# Altium footprint library RODION.PcbLib: 131 footprints (part 5 of 9)
Each footprint in its own frame and in the unit in brackets; x right, y up, seen from the top. Pads: shape width x height; smd on the part's side, far side on the other; paste and mask are expansions set on the pad; w line width, h text height; cw(c..) or ccw(c..) is an arc to the next point about the centre after c.
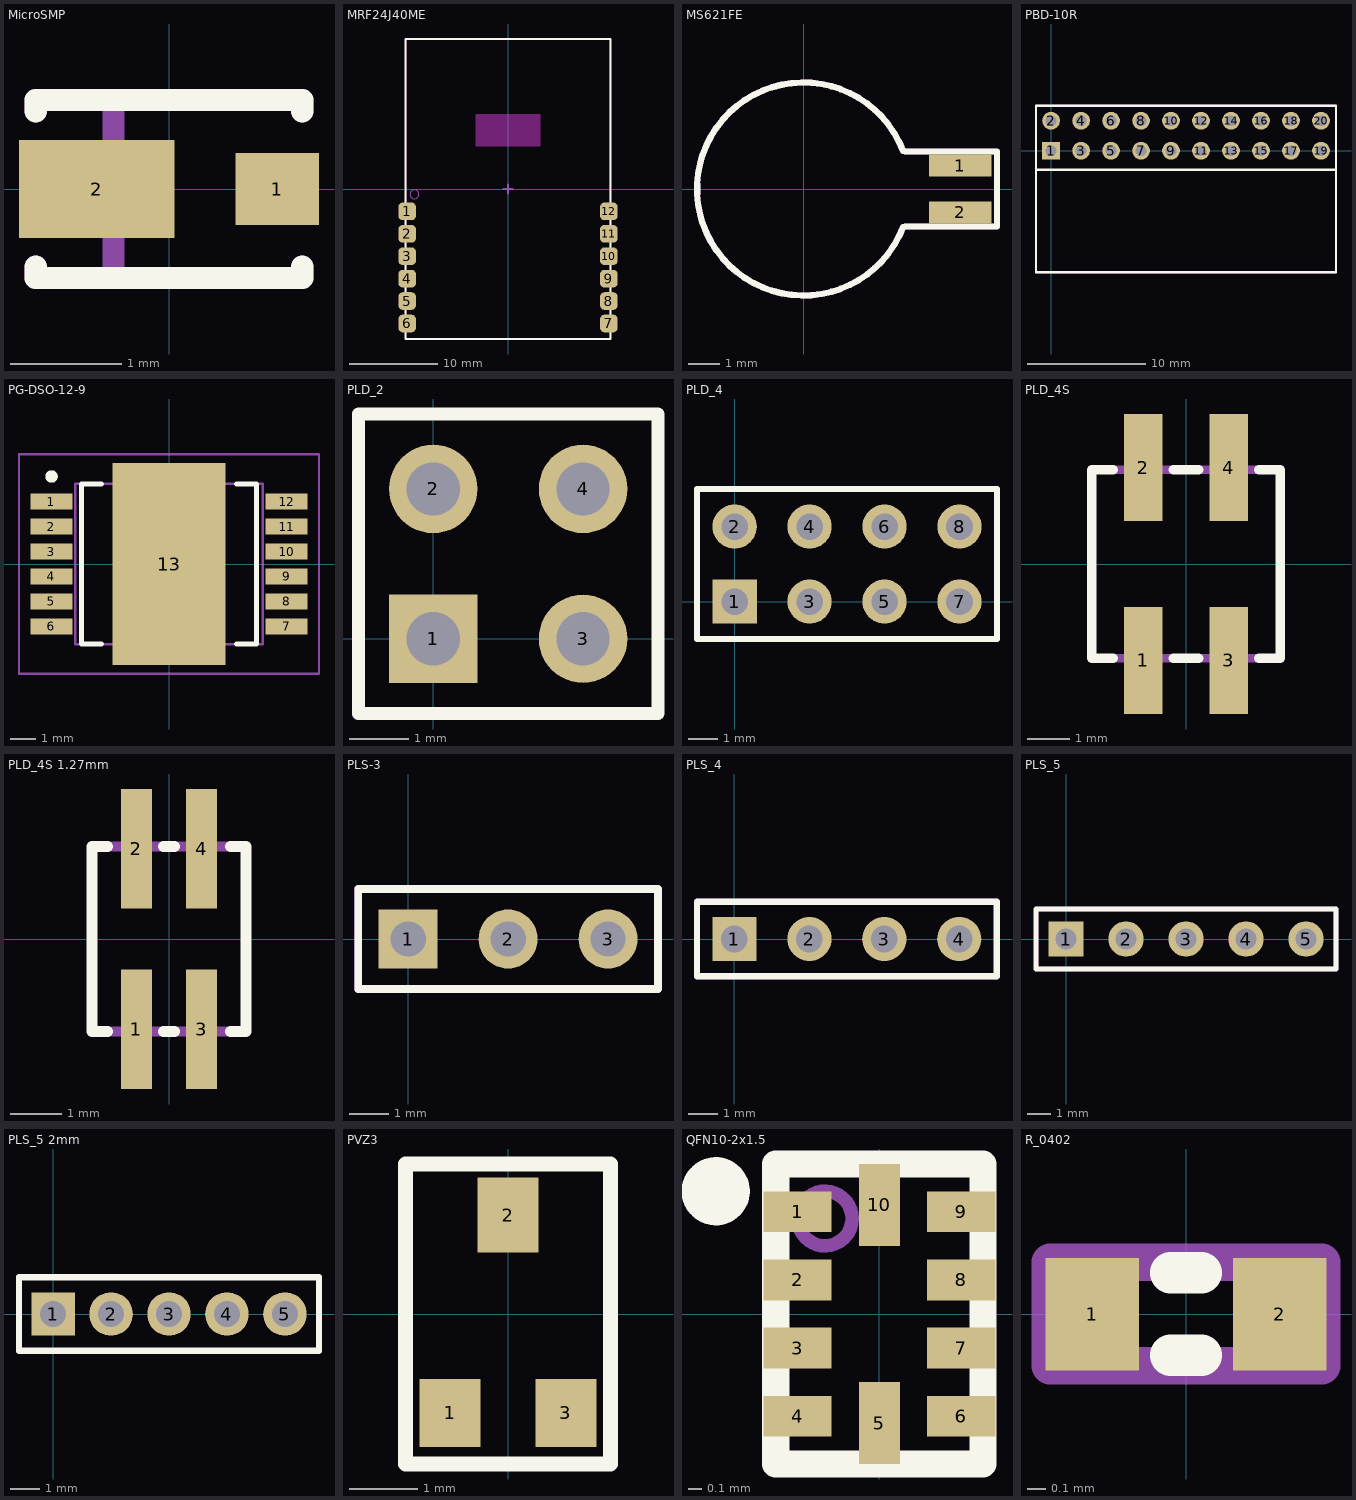
[diagram p4: the footprints below, top view; thin cyan lines are the x and y axes]

## MicroSMP [mm] "MicroSMP; 2 Leads"
height 0.68
pads (2):
  rect 0.75x0.65 smd: 1(0.975,0)
  rect 1.4x0.88 smd: 2(-0.65,0)
Top Overlay:
  lines w0.2: -1.2,-0.7 -1.2,-0.8 1.2,-0.8 1.2,-0.7 ; -1.2,0.7 -1.2,0.8 1.2,0.8 1.2,0.7
Top_Assy:
  lines w0.2: -1.2,-0.7 -1.2,-0.8 1.2,-0.8 1.2,-0.7 ; -1.2,0.7 -1.2,0.8 1.2,0.8 1.2,0.7 ; -0.5,-0.8 -0.5,0.8
  text ".Designator" at -0.125,-0.425 h1
3D body "MicroSMP.STEP": height 0.73, standoff 0, extent -1.35,-0.7 1.35,0.7

## MRF24J40ME [mm] "Wireless Transceiver"
height 4
pads (12):
  rrect50% 2x2 smd: 1(-11.43,-2.54) 2(-11.43,-5.08) 3(-11.43,-7.62) 4(-11.43,-10.16) 5(-11.43,-12.7) 6(-11.43,-15.24) 7(11.43,-15.24) 8(11.43,-12.7) 9(11.43,-10.16) 10(11.43,-7.62) 11(11.43,-5.08) 12(11.43,-2.54)
Top Overlay:
  lines w0.2: -11.6,-17 11.6,-17 ; -11.6,17 11.6,17
  lines w0.22: -11.6,-17 -11.6,17 ; 11.6,-17 11.6,17
Keep-Out Layer:
  rectangle: -3.68,4.82 3.68,8.5
Top_Assy:
  circle w0.1: c-10.6,-0.6 r0.5
  lines w0.2: -0.5,0 0.5,0 ; 0,-0.5 0,0.5 ; -11.6,-17 11.6,-17 11.6,17 -11.6,17 -11.6,-17
  text ".Designator" at -5.975,-5.275 h1
3D body "MRF24J40MB.STEP": height 3.36, standoff 0, extent -11.43,-16.51 11.43,16.51

## MS621FE [mm] "RTC Battery"
height 2.7
pads (2):
  rect 2x0.7 smd: 1(5,0.75) 2(5,-0.75)
Top Overlay:
  lines w0.2: 3.174,-1.218 cw(c0,0) 3.174,1.218 ; 3.25,-1.2 6.175,-1.2 6.175,1.2 3.25,1.2
Top_Assy:
  lines w0.2: 3.174,-1.218 cw(c0,0) 3.174,1.218 ; 3.25,-1.2 6.175,-1.2 6.175,1.2 3.25,1.2
  text ".Designator" at -2.5,-0.325 h1
3D body "MS621FE.stp": height 2.71, standoff 0.01, extent -3.4,-3.424 5.9,3.375

## PBD-10R [mm] "Connector; Header; 10x2 Position, Right angle"
height 5.08
pads (20):
  rect 1.5x1.5 hole 0.9: 1(0,0)
  round 1.5 hole 0.9: 2(0,2.54) 3(2.54,0) 4(2.54,2.54) 5(5.08,0) 6(5.08,2.54) 7(7.62,0) 8(7.62,2.54) 9(10.16,0) 10(10.16,2.54) 11(12.7,0) 12(12.7,2.54) 13(15.24,0) 14(15.24,2.54) 15(17.78,0) 16(17.78,2.54) 17(20.32,0) 18(20.32,2.54) 19(22.86,0) 20(22.86,2.54)
Top Overlay:
  lines w0.2: -1.27,-1.6 24.13,-1.6 ; -1.27,-10.3 -1.27,3.81 24.13,3.81 24.13,-10.3 -1.27,-10.3
Top_Assy:
  lines w0.2: -1.275,-10.3 24.13,-10.3 24.13,3.815 -1.275,3.815 -1.275,-10.3
  text ".Designator" at 6.9,-3.3 h1
3D body "PBD-20R.STEP": height 2.55, standoff -5.45, extent -1.27,-10.16 24.13,2.86

## PG-DSO-12-9 [mm] "SOP,1.00mm pitch;12 pin,7.50mm W X 6.40mm L X 2.60mm H body (w/thermal tab)"
height 2.6
pads (13):
  rect 1.67x0.65 smd paste+0 mask+0: 1(-4.7,2.5) 2(-4.7,1.5) 3(-4.7,0.5) 4(-4.7,-0.5) 5(-4.7,-1.5) 6(-4.7,-2.5) 7(4.7,-2.5) 8(4.7,-1.5) 9(4.7,-0.5) 10(4.7,0.5) 11(4.7,1.5) 12(4.7,2.5)
  rect 4.5x8.1 smd paste+0 mask+0: 13(0,0)
Top Overlay:
  circle w0.25: c-4.7,3.5 r0.125
  lines w0.2: -2.7,-3.2 -3.5,-3.2 -3.5,3.2 -2.7,3.2 ; 2.7,-3.2 3.5,-3.2 3.5,3.2 2.7,3.2
Mechanical 3:
  text ".DESIGNATOR" at 0,0 h1.2
Top_Assy:
  lines w0.1: -3.75,-3.2 3.75,-3.2 3.75,3.2 -3.75,3.2 -3.75,-3.2
Mechanical 15:
  lines w0.1: -0.5,0 0.5,0 ; 0,-0.5 0,0.5 ; -6,-4.4 -6,4.4 6,4.4 6,-4.4 -6,-4.4
3D body "PG-DSO-12-16_C66065-A6420-C011-02-0004.stp": height 2.61, standoff 0, extent -5.15,-3.9 5.15,3.9

## PLD_2 [mm] "Connector; Header; 2x2 Position"
pads (4):
  rect 1.5x1.5 hole 0.9: 1(0,0)
  round 1.5 hole 0.9: 2(0,2.54) 3(2.54,0) 4(2.54,2.54)
Top Overlay:
  lines w0.22: -1.27,-1.27 3.81,-1.27 3.81,3.81 -1.27,3.81 -1.27,-1.27
Top_Assy:
  lines w0.2: -1.275,-1.275 3.805,-1.275 3.805,3.805 -1.275,3.805 -1.275,-1.275
  text ".Designator" at -1.225,1.225 h1
3D body "Pin Header 2x2 TH Pitch 2.54mm.stp": height 9.5, standoff -3.2, extent -1.27,-1.27 3.81,3.81

## PLD_4 [mm] "Connector; Header; 4x2 Position"
pads (8):
  rect 1.5x1.5 hole 0.9: 1(0,0)
  round 1.5 hole 0.9: 2(0,2.54) 3(2.54,0) 4(2.54,2.54) 5(5.08,0) 6(5.08,2.54) 7(7.62,0) 8(7.62,2.54)
Top Overlay:
  lines w0.2: -1.27,-1.27 8.89,-1.27 8.89,3.81 -1.27,3.81 -1.27,-1.27
Top_Assy:
  lines w0.2: -1.275,-1.265 -1.275,3.815 8.885,3.815 8.885,-1.265 -1.275,-1.265
  text ".Designator" at -0.475,1.375 h1
3D body "Pin Header 2x4 TH Pitch 2.54mm.stp": height 9.5, standoff -3.2, extent -1.27,-1.27 8.89,3.81

## PLD_4S [mm] "PLD_4S"
height 6
pads (4):
  rect 0.9x2.5 smd: 1(-1,-2.25) 2(-1,2.25) 3(1,-2.25) 4(1,2.25)
Top Overlay:
  lines w0.22: -1.7,-2.2 -2.2,-2.2 -2.2,2.2 -1.7,2.2 ; -0.3,-2.2 0.3,-2.2 ; -0.3,2.2 0.3,2.2 ; 1.7,-2.2 2.2,-2.2 2.2,2.2 1.7,2.2
Top_Assy:
  lines w0.2: -2.2,-2.2 2.2,-2.2 2.2,2.2 -2.2,2.2 -2.2,-2.2
  text ".Designator" at -2.15,-0.15 h1

## PLD_4S 1.27mm [mm] "PLD_4S 1.27mm"
height 6
pads (4):
  rect 0.6x2.33 smd: 1(-0.635,-1.755) 2(-0.635,1.755) 3(0.635,-1.755) 4(0.635,1.755)
Top Overlay:
  lines w0.22: -1.2,-1.8 -1.5,-1.8 -1.5,1.8 -1.2,1.8 ; -0.1,-1.8 0.1,-1.8 ; -0.1,1.8 0.1,1.8 ; 1.2,-1.8 1.5,-1.8 1.5,1.8 1.2,1.8
Top_Assy:
  lines w0.2: -1.5,-1.8 1.5,-1.8 1.5,1.8 -1.5,1.8 -1.5,-1.8
  text ".Designator" at -1.725,0.075 h1
3D body "PLD2-2S 1.27.STEP": height 4.5, standoff 0, extent -1.27,-2.75 1.27,2.75

## PLS-3 [mm] "Connector; Header; 3 Position"
pads (3):
  rect 1.5x1.5 hole 0.9: 1(0,0)
  round 1.5 hole 0.9: 2(2.54,0) 3(5.08,0)
Top Overlay:
  lines w0.2: -1.27,-1.27 6.35,-1.27 6.35,1.27 -1.27,1.27 -1.27,-1.27
Top_Assy:
  lines w0.2: -1.275,-1.27 -1.275,1.27 6.345,1.27 6.345,-1.27 -1.275,-1.27
  text ".Designator" at -1.325,0.05 h1
3D body "Pin Header 1x3 TH Pitch 2.54mm.stp": height 9.5, standoff -3.2, extent -1.27,-1.27 6.35,1.27

## PLS_4 [mm] "Connector; Header; 4 Position"
pads (4):
  rect 1.5x1.5 hole 0.9: 1(0,0)
  round 1.5 hole 0.9: 2(2.54,0) 3(5.08,0) 4(7.62,0)
Top Overlay:
  lines w0.22: -1.27,-1.27 -1.27,1.27 8.89,1.27 8.89,-1.27 -1.27,-1.27
Top_Assy:
  lines w0.2: -1.26,-1.27 8.9,-1.27 8.9,1.27 -1.26,1.27 -1.26,-1.27
  text ".Designator" at -0.35,0.075 h1
3D body "Pin Header 1x4 TH Pitch 2.54mm.stp": height 9.5, standoff -3.2, extent -1.27,-1.27 8.89,1.27

## PLS_5 [mm] "Connector; Header; 5 Position"
pads (5):
  rect 1.5x1.5 hole 0.9: 1(0,0)
  round 1.5 hole 0.9: 2(2.54,0) 3(5.08,0) 4(7.62,0) 5(10.16,0)
Top Overlay:
  lines w0.22: -1.27,-1.27 11.43,-1.27 11.43,1.27 -1.27,1.27 -1.27,-1.27
Top_Assy:
  lines w0.2: -1.26,-1.27 -1.26,1.27 11.43,1.27 11.43,-1.27 -1.26,-1.27
  text ".Designator" at -0.35,0.075 h1
3D body "Pin Header 1x5 TH Pitch 2.54mm.stp": height 9.5, standoff -3.2, extent -1.27,-1.27 11.43,1.27

## PLS_5 2mm [mm] "Connector; Header; 5 Position 2mm"
pads (5):
  rect 1.5x1.5 hole 0.9: 1(0,0)
  round 1.5 hole 0.9: 2(2,0) 3(4,0) 4(6,0) 5(8,0)
Top Overlay:
  lines w0.22: -1.175,-1.27 9.175,-1.27 9.175,1.27 -1.175,1.27 -1.175,-1.27
Top_Assy:
  lines w0.2: -1.175,-1.27 9.175,-1.27 9.175,1.27 -1.175,1.27 -1.175,-1.27
  text ".Designator" at -0.5,-0.475 h1
3D body "PLS-5.STEP": height 6.05, standoff -2.75, extent -1,-1 9,1

## PVZ3 [mm] "PVZ3 Potentiometer, 3-Leads, Body 3.1x3.2mm"
height 1.85
pads (3):
  rect 0.9x1 smd: 1(-0.85,-1.45) 3(0.85,-1.45)
  rect 0.9x1.1 smd: 2(0,1.45)
Top Overlay:
  lines w0.22: -1.5,-2.2 -1.5,2.2 1.5,2.2 1.5,-2.2 -1.5,-2.2
Top_Assy:
  lines w0.2: -1.5,-2.2 1.5,-2.2 1.5,2.2 -1.5,2.2 -1.5,-2.2
  text ".Designator" at -2.1,0 h1
3D body "PVZ3A.STEP": height 1.95, standoff 0, extent -1.55,-1.85 1.55,1.84

## QFN10-2x1.5 [mm] "QFN, 10-Leads, Body 2x1.5mm, Pitch 0.2mm"
height 0.55
pads (10):
  rect 0.5x0.3 smd paste-1.1 mask+0.07: 1(-0.6,0.75) 2(-0.6,0.25) 3(-0.6,-0.25) 4(-0.6,-0.75) 6(0.6,-0.75) 7(0.6,-0.25) 8(0.6,0.25) 9(0.6,0.75)
  rect 0.3x0.6 smd paste-1.1 mask+0.07: 5(0,-0.8) 10(0,0.8)
Top Overlay:
  circle w0.25: c-1.2,0.9 r0.125
  lines w0.2: -0.76,-1.1 0.76,-1.1 0.76,1.1 -0.76,1.1 -0.76,-1.1
Top_Assy:
  circle w0.1: c-0.4,0.7 r0.2
  lines w0.1: -0.76,-1.1 0.76,-1.1 0.76,1.1 -0.76,1.1 -0.76,-1.1
  text ".Designator" at -0.6,-0.6 h1
3D body "QFN10-2x1.5mm.step": height 0.56, standoff -0.04, extent -0.75,-1 0.75,1

## R_0402 [mm] "Chip, Body 1.6x0.85mm, IPC High Density"
height 0.9
pads (2):
  rect 0.5x0.6 smd mask+0.05: 1(-0.5,0) 2(0.5,0)
Top Overlay:
  lines w0.22: -0.083,-0.22 0.083,-0.22 ; -0.083,0.22 0.083,0.22
Top_Assy:
  lines w0.2: -0.725,-0.275 0.725,-0.275 0.725,0.275 -0.725,0.275 -0.725,-0.275
  text ".Designator" at -1.85,-0.025 h1
3D body "RES0402.stp": height 0.3, standoff 0, extent -0.5,-0.25 0.5,0.25